# Altium integrated library main_lib.IntLib: 154 symbols (part 2 of 2)

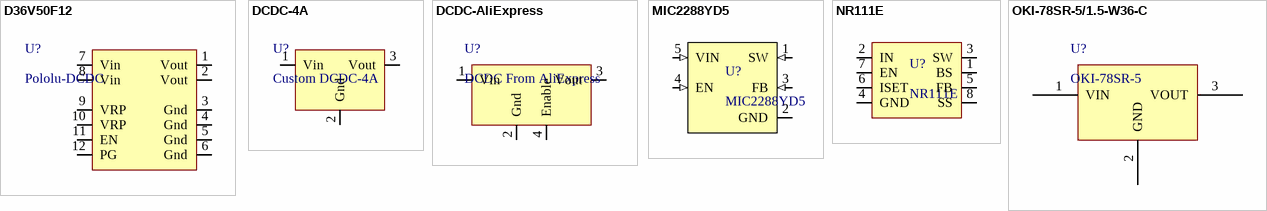
[diagram p23: symbols D36V50F12 to OKI-78SR-5/1.5-W36-C]

## D36V50F12
designator U?, comment Pololu-DCDC
Grade: None; Supplier 1: Emile; Supplier Part Number 1: N/A; HelpURL: https://github.com/mimil2014/4A-DC-DC; Package / Case: Custom; Mounted: Yes
footprint D36V50F12 (Connector; Header; 2 Position)
pins: 1 Vout, 2 Vout, 3 Gnd, 4 Gnd, 5 Gnd, 6 Gnd, 7 Vin, 8 Vin, 9 VRP, 10 VRP, 11 EN, 12 PG

## DCDC-4A
designator U?, comment Custom DCDC-4A
Custom PCB DCDC-4A; Grade: None; Supplier 1: Emile; Supplier Part Number 1: N/A; HelpURL: https://github.com/mimil2014/4A-DC-DC; Package / Case: Custom; Mounted: Yes
footprint DC-DC-4A (Connector; Header; 2 Position)
pins: 1 Vin, 2 Gnd, 3 Vout

## DCDC-AliExpress
designator U?, comment DCDC From AliExpress
DCDC Able to do 1.8v, 2.5v, 3.3v, 5v, 9v and 12v; Grade: None; Supplier 1: Aliexpress; Supplier Part Number 1: N/A; Mounted: Yes
footprint DCDC-AliExpress (Non-Isolated Switching Regulator DC-DC TO-220)
pins: 1 Vin, 2 Gnd, 3 Vout, 4 Enable

## MIC2288YD5
designator U?
Boost Switching Regulator IC Positive Adjustable 2.5V 1 Output 1.2A (Switch) SOT-23-5 Thin, TSOT-23-5; Grade: None; Supplier 1: Digi-Key; Supplier Part Number 1: 576-1729-2-ND; HelpURL: https://ww1.microchip.com/downloads/en/DeviceDoc/MIC2288-Data-Sheet-DS20006034C.pdf; Package / Case: SOT23; Mounted: Yes
footprint SOT-23-5 (SOT23-5, from TI DDC (R-PDSO-G6), modified from 6 to 5 pins)
pins: 1 SW (in), 2 GND (power), 3 FB (in), 4 EN (in), 5 VIN (in)

## NR111E
designator U?
IC REG BUCK ADJUSTABLE 4A 8SOIC; Grade: None; Supplier 1: Digi-Key; Supplier Part Number 1: NR111ECT-ND; HelpURL: https://www.digikey.ca/en/products/detail/sanken/NR111E/4289131; Package / Case: 8-SOIC-EP; Mounted: Yes
footprint SOIC-8-EXPOSED-PAD (8-Lead Plastic Small Outline, 0.15in pitch,  LTC DWG # 05-08-1610 Rev G)
pins: 1 BS, 2 IN, 3 SW, 4 GND, 5 FB, 6 ISET, 7 EN, 8 SS, 9 GND

## OKI-78SR-5/1.5-W36-C
designator U?, comment OKI-78SR-5
DC DC CONVERTER 5V 8W; Manufacturer: Murata Power Solutions Inc.; Manufacturer Part Number: OKI-78SR-5/1.5-W36-C; Voltage - Input (Min): 7V; Voltage - Input (Max): 36V; Current - Output (Max): 1.5A; Efficiency: 90.5%; Supplier 1: Digi-Key; RoHS: RoHS Compliant; Category: Power Supplies - Board Mount; Stock 1: 43226; Pricing 1: 1=6.02, 5=5.964, 10=5.922, 25=5.8376, 50=5.6556, 100=5.2916, 250=5.04568 (CAD); Packaging: Tray; Part Status: Active; Type: Linear Regulator Replacement; Voltage - Output 1: 5V; Voltage - Output 2: -; Voltage - Output 3: -; Applications: ITE (Commercial); Features: SCP; Operating Temperature: -40°C ~ 85°C; Mounting Type: Through Hole; Package / Case: 3-SIP Module; Size / Dimension: 0.41" L x 0.30" W x 0.65" H (10.4mm x 7.6mm x 16.5mm); Control Features: -; ComponentLink1URL: https://power.murata.com/data/power/oki-78sr.pdf; ComponentLink1Description: https://power.murata.com/data/power/oki-78sr.pdf; Supplier Part Number 1: 811-2196-5-ND
footprint OKI-78SR (Non-Isolated Switching Regulator DC-DC TO-220)
footprint OKI-78SR-HM (Non-Isolated Switching Regulator DC-DC TO-220 horizontal mount)
pins: 1 VIN (power), 2 GND (power), 3 VOUT (power)


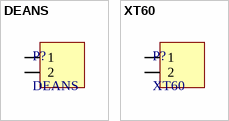
[diagram p24: symbols DEANS to XT60]

## DEANS
designator P?
Supplier 1: Digi-Key; Supplier Part Number 1: N/A277-1667-ND; Mounted: Yes; Package / Case: TH; Volt: N/A
footprint DEANS (Connector; Header; 2 Position)
pins: 1, 2

## XT60
designator P?
Supplier 1: Digi-Key; Supplier Part Number 1: N/A277-1667-ND; Mounted: Yes; Package / Case: TH; Volt: N/A
footprint XT60 (Connector; Header; 2 Position)
pins: 1, 2


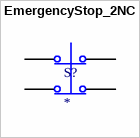
[diagram p25: symbol EmergencyStop_2NC]

## EmergencyStop_2NC
designator S?
EmergencyStop_2NC Symbol
pins: NC1-1 *, NC1-2 *, NC2-1 *, NC2-2 *


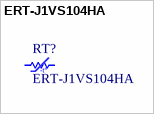
[diagram p26: symbol ERT-J1VS104HA]

## ERT-J1VS104HA
designator RT?
THERM NTC 100KOHM 4330K 0603; Value: 100K; Precision: 3%; Supplier 1: Digi-Key; Supplier Part Number 1: P12018TR-ND; Package / Case: 0603 (1608 Metric); Mounted: Yes
footprint CAPACITOR-0603 (Metric 1608, EIA 0603. Per Yageo Product Specification V2.2)
pins: 1, 2
text: -t°


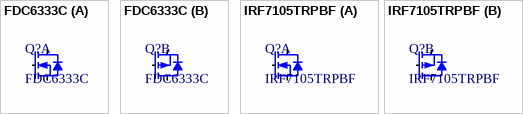
[diagram p27: symbols FDC6333C to IRF7105TRPBF]

## FDC6333C
designator Q?
Mosfet Array 30V 2.5A, 2A 700mW Surface Mount SuperSOT™-6,  A=N-CH. B=P-CH; Supplier 1: Digi-Key; Supplier Part Number 1: FDC6333CCT-ND; Volt: 30V; Package / Case: SOT-23-6 Thin; Mounted: Yes; Current: 2.5A ,2A; helpURL: https://www.onsemi.com/pdf/datasheet/fdc6333c-d.pdf
footprint SOT-23-6 (SOT23-6, from TI DDC (R-PDSO-G6))
part A pins: 1 G, 5 S, 6 D
part B pins: 2 S, 3 G, 4 D

## IRF7105TRPBF
designator Q?
Mosfet Array 25V 3.5A, 2.3A 2W Surface Mount 8-SO. A=N-CH. B=P-CH; Supplier 1: Digi-Key; Supplier Part Number 1: IRF7105PBFTR-ND; Volt: 25V; Package / Case: 8-SOIC; Mounted: Yes; Current: 3.5A ,2.3A
footprint SOIC-8-EXPOSED-PAD (8-Lead Plastic Small Outline, 0.15in pitch,  LTC DWG # 05-08-1610 Rev G)
part A pins: 1 S, 2 G, 7 D, 8 D
part B pins: 3 S, 4 G, 5 D, 6 D


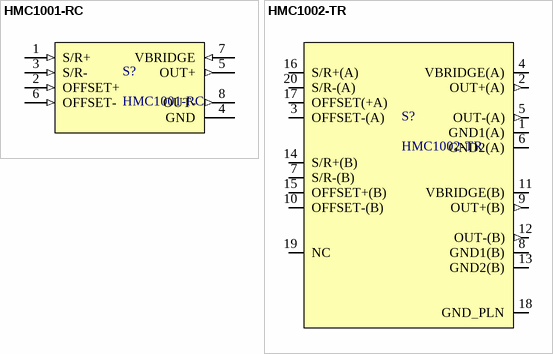
[diagram p28: symbols HMC1001-RC to HMC1002-TR]

## HMC1001-RC
designator S?
Magnetoresistive Sensor Single Axis 8- Pin SIP; Supplier 1: Digi-Key; Supplier Part Number 1: 342-1001-5-ND; Value: N/A; Precision: N/A; Package / Case: 8-SIP; Mounted: Yes
footprint SIP-8
pins: 1 S/R+ (in), 2 OFFSET+ (in), 3 S/R- (in), 4 GND (power), 5 OUT+ (out), 6 OFFSET- (in), 7 VBRIDGE (in), 8 OUT- (out)

## HMC1002-TR
designator S?
Magnetoresistive Sensor X, Y Axis 20-SOIC; Supplier 1: Digi-Key; Supplier Part Number 1: 342-1070-2-ND; Value: N/A; Precision: N/A; Package / Case: 20-SOIC; Mounted: Yes
footprint SOIC20_HNW-M
pins: 1 GND1(A) (power), 2 OUT+(A) (out), 3 OFFSET-(A) (io), 4 VBRIDGE(A), 5 OUT-(A) (out), 6 GND2(A) (power), 7 S/R-(B) (io), 8 GND1(B) (power), 9 OUT+(B) (out), 10 OFFSET-(B) (io), 11 VBRIDGE(B), 12 OUT-(B) (out), 13 GND2(B) (power), 14 S/R+(B), 15 OFFSET+(B), 16 S/R+(A), 17 OFFSET(+A), 18 GND_PLN (power), 19 NC, 20 S/R-(A) (io)


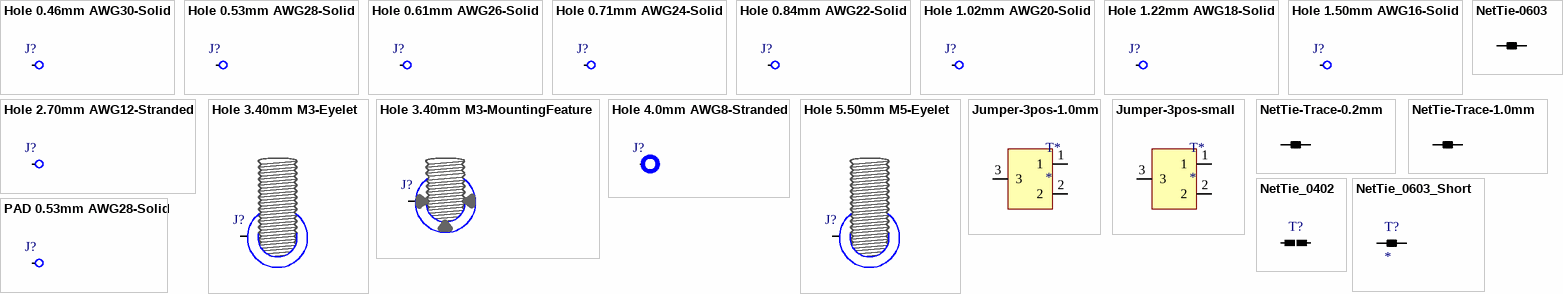
[diagram p29: symbols Hole 0.46mm AWG30-Solid to PAD 0.53mm AWG28-Solid]

## Hole 0.46mm AWG30-Solid
designator J?, comment hole  (value not drawn)  (no BOM)
Hole for 30 AWG Solid Wire; Mounted: N/A
footprint HOLE-0.46MM (Hole 0.46mm)
pins: 1

## Hole 0.53mm AWG28-Solid
designator J?, comment hole  (value not drawn)  (no BOM)
Hole for 28 AWG Solid Wire; Mounted: N/A
footprint HOLE-0.53MM (Hole 0.53mm)
pins: 1

## Hole 0.61mm AWG26-Solid
designator J?, comment hole  (value not drawn)  (no BOM)
Hole for 26 AWG Solid Wire; Mounted: N/A
footprint HOLE-0.61MM (Hole 0.61mm)
pins: 1

## Hole 0.71mm AWG24-Solid
designator J?, comment hole  (value not drawn)  (no BOM)
Hole for 24 AWG Solid Wire; Mounted: N/A
footprint HOLE-0.71MM (Hole 0.71mm)
pins: 1

## Hole 0.84mm AWG22-Solid
designator J?, comment hole  (value not drawn)  (no BOM)
Hole for 22 AWG Solid Wire; Mounted: N/A
footprint HOLE-0.84MM (Hole 0.84mm)
pins: 1

## Hole 1.02mm AWG20-Solid
designator J?, comment hole  (value not drawn)  (no BOM)
Hole for 20 AWG Solid Wire; Mounted: N/A
footprint HOLE-1.02MM (Hole 1.02mm)
pins: 1

## Hole 1.22mm AWG18-Solid
designator J?, comment hole  (value not drawn)  (no BOM)
Hole for 18 AWG Solid Wire; Mounted: N/A
footprint HOLE-1.22MM (Hole 1.22mm)
pins: 1

## Hole 1.50mm AWG16-Solid
designator J?, comment hole  (value not drawn)  (no BOM)
Hole for 16 AWG Solid Wire; Mounted: N/A
footprint HOLE-1.50MM (Hole 1.50mm)
pins: 1

## Hole 2.70mm AWG12-Stranded
designator J?, comment hole  (value not drawn)  (no BOM)
Hole for 12 AWG Stranded Wire; Mounted: N/A
footprint HOLE-2.70MM (Hole 2.70mm)
pins: 1

## Hole 3.40mm M3-Eyelet
designator J?, comment hole  (value not drawn)  (no BOM)
Hole for M3 Bolt with 8mm pad; Mounted: N/A
footprint HOLE-3.40MM-M3-8MMEYELET (Hole 3.40mm with round pad for eyelet)
pins: 1

## Hole 3.40mm M3-MountingFeature
designator J?, comment hole  (value not drawn)  (no BOM)
Hole for M3 Bolt with 7mm pad; Mounted: N/A
footprint HOLE-3.40MM-M3-7MMEYELET-MountingFeature (Hole 3.40mm with round pad for eyelet)
pins: 1

## Hole 4.0mm AWG8-Stranded
designator J?, comment hole  (value not drawn)  (no BOM)
Hole 4.0mm for 8 AWG Stranded Wire; Mounted: N/A
footprint HOLE-4.00MM (Hole 4.00mm)
pins: 1

## Hole 5.50mm M5-Eyelet
designator J?, comment hole  (value not drawn)  (no BOM)
Hole for M5 Bolt with 15mm pad; Mounted: N/A
footprint HOLE-5.50MM-M5-15MMEYELET (Hole 5.50mm with round pad for eyelet)
pins: 1

## Jumper-3pos-1.0mm
designator T*
footprint Jumper-3pos (3 pos selection)
pins: 1, 2, 3

## Jumper-3pos-small
designator T*
footprint Jumper-3pos-small (3 pos selection)
pins: 1, 2, 3

## NetTie-0603
designator T?, comment NETTIE  (value not drawn)  (net tie, no BOM)
Net Tie based on a 0603 land pattern; Mounted: N/A
footprint NetTie-0603 (NetTie based on a EIA 0603 land pattern)
pins: 1, 2

## NetTie-Trace-0.2mm
designator T?, comment NETTIE  (value not drawn)  (net tie, no BOM)
Net Tie based on a 0.2mm trace; Mounted: N/A
footprint NetTie-Trace-0.2mm (Net Tie with a 0.2mm trace)
pins: 1, 2

## NetTie-Trace-1.0mm
designator T?, comment NETTIE  (value not drawn)  (net tie, no BOM)
Net Tie based on a 1.0mm trace; Mounted: N/A
footprint NetTie-Trace-1.0mm (Net Tie with a 1.0mm trace)
pins: 1, 2

## NetTie_0402
designator T?  (value not drawn)
footprint NetTie-0402 (Metric 1005, EIA 0402 Drawn per Yageo "Chip resistors Mounting" rev 10)
pins: 1, 2

## NetTie_0603_Short
designator T?
footprint NetTie-0603-short (Net Tie with an EIA 0603 land pattern)
pins: 1, 2

## PAD 0.53mm AWG28-Solid
designator J?, comment hole  (value not drawn)  (no BOM)
PAD for 28 AWG Solid Wire; Mounted: N/A
footprint PAD-0.53MM (Hole 0.53mm)
pins: 1


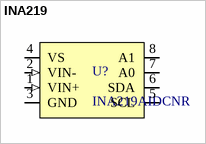
[diagram p30: symbol INA219]

## INA219
designator U?, comment INA219AIDCNR
IC CURRENT MONITOR 1% SOT23-8; Supplier 1: Digi-Key; Supplier Part Number 1: 296-23770-1-ND; Package / Case: SOT-23-8; Mounted: Yes; helpURL: https://www.ti.com/lit/ds/symlink/ina219.pdf?HQS=dis-dk-null-digikeymode-dsf-pf-null-wwe&ts=1696014906509&ref_url=https%253A%252F%252Fwww.ti.com%252Fgeneral%252Fdocs%252Fsuppproductinfo.tsp%253FdistId%253D10%2526gotoUrl%253Dhttps%253A%252F%252Fwww.ti.com%252Flit%252Fgpn%252Fina219
footprint SOT-23-8
pins: 1 VIN+ (in), 2 VIN- (in), 3 GND (power), 4 VS (power), 5 SCL, 6 SDA, 7 A0, 8 A1


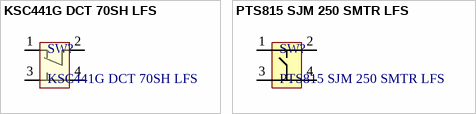
[diagram p31: symbols KSC441G DCT 70SH LFS to PTS815 SJM 250 SMTR LFS]

## KSC441G DCT 70SH LFS
designator SW?
TACT 6.2 X 6.2, 5.2 MM H, 4.75N, SPDT; Volt: 32V; Current: 0.05A; Supplier 1: Digi-Key; Supplier Part Number 1: CKN12187TR-ND; Mounted: Yes
footprint Switch_KSC441G DCT 70SH LFS
pins: 1, 2, 3, 4

## PTS815 SJM 250 SMTR LFS
designator SW?
TACT 4.2 X 3.2, 2.5 MM H, 180GF,; Volt: 12V; Current: 0.05A; Supplier 1: Digi-Key; Supplier Part Number 1: CKN12215-1-ND; Mounted: Yes
footprint SW4_PTS815 SJM 250 SMTR LFS_CNK
pins: 1, 2, 3, 4


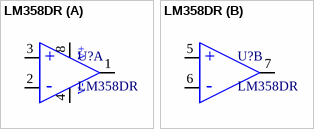
[diagram p32: symbol LM358DR]

## LM358DR
designator U?
IC OPAMP GP 2 CIRCUIT 8SOIC; Grade: None; Package / Case: SOIC-8; Mounted: Yes; helpURL: https://www.digikey.ca/en/products/detail/texas-instruments/LM358DR/276658?s=N4IgTCBcDa4JwDYC0BGADCgLEsSByAIiALoC%2BQA; Supplier 1: Digi-Key; Supplier Part Number 1: 296-1014-2-ND
footprint SOIC-8 (8-Lead Plastic Small Outline, 0.15in pitch,  LTC DWG # 05-08-1610 Rev G)
part A pins: 1 OUT1, 2 IN1-, 3 IN1+, 4 VS-, 8 VS+
part B pins: 5 IN2+, 6 IN2-, 7 OUT
part A text: V+; +; -; V-
part B text: +; -


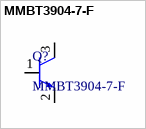
[diagram p33: symbol MMBT3904-7-F]

## MMBT3904-7-F
designator Q?
Bipolar (BJT) Transistor NPN 40 V 200 mA 300MHz 300 mW Surface Mount SOT-23-3; Volt: 40V; Supplier 1: Digi-Key; Supplier Part Number 1: MMBT3904-FDITR-ND; Package / Case: SOT-23-3; Mounted: Yes; ComponentLink1Description: DataSheet; ComponentLink1URL: https://www.diodes.com/assets/Datasheets/MMBT3904.pdf
footprint SOT-23-3 (SOT23-6, from TI DBZ (R-PDSO-G3))
pins: 1, 2, 3


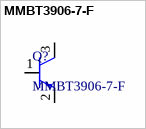
[diagram p34: symbol MMBT3906-7-F]

## MMBT3906-7-F
designator Q?
Bipolar (BJT) Transistor PNP 40 V 200 mA 250MHz 300 mW Surface Mount SOT-23-3; Volt: 20V; Supplier 1: Digi-Key; Supplier Part Number 1: MMBT3906-FDITR-ND; Package / Case: SOT-523; Mounted: Yes; ComponentLink1Description: DataSheet; ComponentLink1URL: https://www.diodes.com/assets/Datasheets/MMBT3906.pdf; HelpURL: https://www.diodes.com/assets/Datasheets/MMBT3906.pdf
footprint SOT-23-3 (SOT23-3, from TI DBZ (R-PDSO-G3))
pins: 1, 2, 3


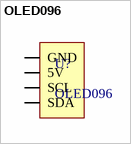
[diagram p35: symbol OLED096]

## OLED096
designator U?
OLED Display I2C 0.96in; Precision: 3%; Supplier 1: Amazon; Supplier Part Number 1: https://www.amazon.ca/-/fr/SSD1306-broches-Arduino-Raspberry-jaune-bleu-IIC/dp/B076PNP2VD/ref=sr_1_5?crid=2VV3LXPB89L69&keywords=i2c+oled&qid=1687918090&sprefix=%2Caps%2C88&sr=8-5; Value: N/A; Package / Case: 0603 (1608 Metric); Mounted: Yes
footprint OLED096
pins: 1 GND, 2 5V, 3 SCL, 4 SDA


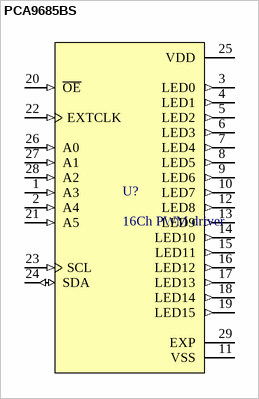
[diagram p36: symbol PCA9685BS]

## PCA9685BS
designator U?, comment 16Ch PWM driver
LED Driver IC 16 Output Linear PWM Dimming 25mA 28-HVQFN (6x6); Supplier 1: Digi-Key; Supplier Part Number 1: 568-5305-2-ND; Package / Case: 28-HVQFN (6x6); Mounted: Yes; HelpURL: https://www.nxp.com/docs/en/data-sheet/PCA9685.pdf
footprint VQFN-28 Exposed Pad
pins: 1 A3 (in), 2 A4 (in), 3 LED0 (out), 4 LED1 (out), 5 LED2 (out), 6 LED3 (out), 7 LED4 (out), 8 LED5 (out), 9 LED6 (out), 10 LED7 (out), 11 VSS (power), 12 LED8 (out), 13 LED9 (out), 14 LED10 (out), 15 LED11 (out), 16 LED12 (out), 17 LED13 (out), 18 LED14 (out), 19 LED15 (out), 20 ~{OE} (in), 21 A5 (in), 22 EXTCLK (in), 23 SCL (in), 24 SDA (io), 25 VDD (power), 26 A0 (in), 27 A1 (in), 28 A2 (in), 29 EXP (power)


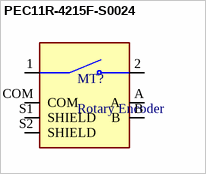
[diagram p37: symbol PEC11R-4215F-S0024]

## PEC11R-4215F-S0024
designator MT?, comment Rotary Encoder
Incremental Encoder, 12 Mm, Contact Rating 10 Ma - 5 Vdc; MP: PEC11R-4215F-S0024; Price: None; Availability: Unavailable; Value: *; Package: None
footprint XDCR_PEC11R-4215F-S0024
pins: 1, 2, A, B, COM, S1 SHIELD, S2 SHIELD


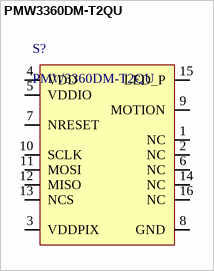
[diagram p38: symbol PMW3360DM‐T2QU]

## PMW3360DM‐T2QU
designator S?
Optical Navigation Chip; IP Protected: Yes; Supplier 1: PixArt Imaging Inc; Supplier Part Number 1: PMW3360DM‐T2QU; Value: N/A; Precision: N/A
footprint PMW3360DM-T2QU (PixArt Optical Tracking Sensor)
pins: 1 NC, 2 NC, 3 VDDPIX, 4 VDD, 5 VDDIO, 6 NC, 7 NRESET, 8 GND, 9 MOTION, 10 SCLK, 11 MOSI, 12 MISO, 13 NCS, 14 NC, 15 LED_P, 16 NC


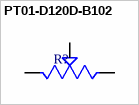
[diagram p39: symbol PT01-D120D-B102]

## PT01-D120D-B102
designator R?, comment Potentiometer  (value not drawn)
PT01-D120D-B102; Watt: 0.05W; Mounted: Yes; Package / Case: Custom; Precision: N/A; Supplier 2: Digi-Key; Supplier 1: Digi-Key; Supplier Part Number 1: PT01-D120D-B102
footprint TRIM_PT01-D120D-B102
pins: 1, 2, 3


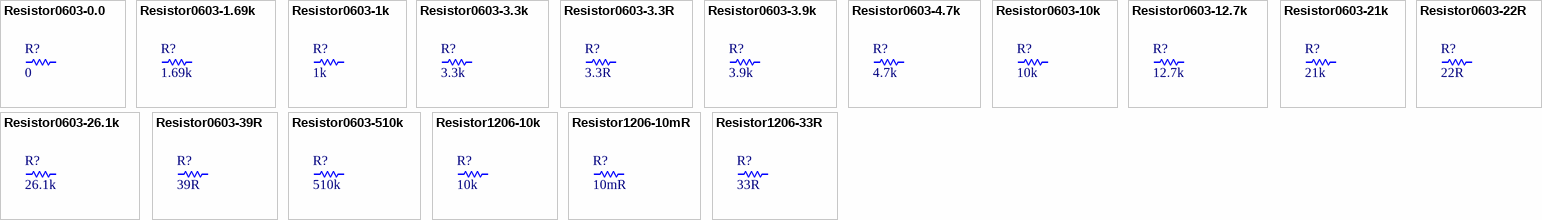
[diagram p40: symbols Resistor0603-0.0 to Resistor1206-33R]

## Resistor0603-0.0
designator R?, comment value 0  (hidden comment: SMT resistor)
Resistor0603-0.0; Precision: 1%; Watt: 0.1W; Mounted: Yes; Package / Case: Metric 1608, EIA 0603; Supplier 2: Digi-Key; Supplier 4: Digi-Key; Supplier Part Number 2: 1276-3510-2-ND; Supplier Part Number 4: 541-0.0GTR-ND; Supplier 1: Digi-Key; Supplier 3: Digi-Key; Supplier Part Number 1: RMCF0603ZT0R00TR-ND; Supplier Part Number 3: YAG1307TR-ND
footprint Resistor-0603
pins: 1, 2

## Resistor0603-1.69k
designator R?, comment value 1.69k  (hidden comment: SMT resistor)
Resistor0603-1.69k; Precision: 1%; Watt: 0.25W; Mounted: Yes; Package / Case: Metric 1608, EIA 0603; Supplier 2: Digi-Key; Supplier 4: Digi-Key; Supplier 1: Digi-Key; Supplier 3: Digi-Key; Supplier Part Number 1: RMCF0603FT1K69CT-ND
footprint Resistor-0603
pins: 1, 2

## Resistor0603-1k
designator R?, comment value 1k  (hidden comment: SMT resistor)
Resistor0603-1k; Precision: 1%; Watt: 0.1W; Mounted: Yes; Package / Case: Metric 1608, EIA 0603; Supplier 2: Digi-Key; Supplier 4: Digi-Key; Supplier Part Number 2: 311-1.00KHRTR-ND; Supplier 1: Digi-Key; Supplier 3: Digi-Key; Supplier Part Number 1: RMCF0603FT1K00TR-ND; Supplier Part Number 3: AG1307TR-ND
footprint Resistor-0603
pins: 1, 2

## Resistor0603-3.3k
designator R?, comment value 3.3k  (hidden comment: SMT resistor)
Resistor0603-3.3k; Precision: 5%; Watt: 0.25W; Mounted: Yes; Package / Case: Metric 1608, EIA 0603; Supplier 2: Digi-Key; Supplier 4: Digi-Key; Supplier 1: Digi-Key; Supplier 3: Digi-Key; Supplier Part Number 1: 311-3.30KHRCT-ND
footprint Resistor-0603
pins: 1, 2

## Resistor0603-3.3R
designator R?, comment value 3.3R  (hidden comment: SMT resistor)
Resistor0603-3.3R; Precision: 5%; Watt: 0.25W; Mounted: Yes; Package / Case: Metric 1608, EIA 0603; Supplier 2: Digi-Key; Supplier 4: Digi-Key; Supplier 1: Digi-Key; Supplier 3: Digi-Key; Supplier Part Number 1: RHM303DTR-ND
footprint Resistor-0603
pins: 1, 2

## Resistor0603-3.9k
designator R?, comment value 3.9k  (hidden comment: SMT resistor)
Resistor0603-3.9k; Precision: 1%; Watt: 0.1W; Mounted: Yes; Package / Case: Metric 1608, EIA 0603; Supplier 2: Digi-Key; Supplier 4: Digi-Key; Supplier 1: Digi-Key; Supplier 3: Digi-Key; Supplier Part Number 1: 311-3.90KHRCT-ND
footprint Resistor-0603
pins: 1, 2

## Resistor0603-4.7k
designator R?, comment value 4.7k  (hidden comment: SMT resistor)
Resistor0603-4.7k; Precision: 1%; Watt: 0.1W; Mounted: Yes; Package / Case: Metric 1608, EIA 0603; Supplier 2: Digi-Key; Supplier 4: Digi-Key; Supplier Part Number 2: RMCF0603FT4K70TR-ND; Supplier 1: Digi-Key; Supplier 3: Digi-Key; Supplier Part Number 1: 311-4.70KHRTR-ND
footprint Resistor-0603
pins: 1, 2

## Resistor0603-10k
designator R?, comment value 10k  (hidden comment: SMT resistor)
Resistor0603-10k; Precision: 1%; Watt: 0.1W; Mounted: Yes; Package / Case: Metric 1608, EIA 0603; Supplier 2: Digi-Key; Supplier 4: Digi-Key; Supplier Part Number 2: RMCF0603FT10K0TR-ND; Supplier 1: Digi-Key; Supplier 3: Digi-Key; Supplier Part Number 1: 311-10.0KHRTR-ND
footprint Resistor-0603
pins: 1, 2

## Resistor0603-12.7k
designator R?, comment value 12.7k  (hidden comment: SMT resistor)
Resistor0603-12.7k; Precision: 1%; Watt: 0.1W; Mounted: Yes; Package / Case: Metric 1608, EIA 0603; Supplier 2: Digi-Key; Supplier 4: Digi-Key; Supplier 1: Digi-Key; Supplier 3: Digi-Key; Supplier Part Number 1: RMCF0603FT12K7CT-ND
footprint Resistor-0603
pins: 1, 2

## Resistor0603-21k
designator R?, comment value 21k  (hidden comment: SMT resistor)
Resistor0603-21k; Precision: 1%; Watt: 0.1W; Mounted: Yes; Package / Case: Metric 1608, EIA 0603; Supplier 2: Digi-Key; Supplier 4: Digi-Key; Supplier 1: Digi-Key; Supplier 3: Digi-Key; Supplier Part Number 1: 311-21.0KHRCT-ND
footprint Resistor-0603
pins: 1, 2

## Resistor0603-22R
designator R?, comment value 22R  (hidden comment: SMT resistor)
Resistor0603-22R; Precision: 1%; Watt: 0.1W; Mounted: Yes; Package / Case: Metric 1608, EIA 0603; Supplier 2: Digi-Key; Supplier 4: Digi-Key; Supplier 1: Digi-Key; Supplier 3: Digi-Key; Supplier Part Number 1: RMCF0603FT22R0CT-ND
footprint Resistor-0603
pins: 1, 2

## Resistor0603-26.1k
designator R?, comment value 26.1k  (hidden comment: SMT resistor)
Resistor0603-26.1k; Precision: 1%; Watt: 0.1W; Mounted: Yes; Package / Case: Metric 1608, EIA 0603; Supplier 2: Digi-Key; Supplier 4: Digi-Key; Supplier 1: Digi-Key; Supplier 3: Digi-Key; Supplier Part Number 1: 311-26.1KHRCT-ND
footprint Resistor-0603
pins: 1, 2

## Resistor0603-39R
designator R?, comment value 39R  (hidden comment: SMT resistor)
Resistor0603-39R; Precision: 1%; Watt: 0.1W; Mounted: Yes; Package / Case: Metric 1608, EIA 0603; Supplier 2: Digi-Key; Supplier 4: Digi-Key; Supplier 1: Digi-Key; Supplier 3: Digi-Key; Supplier Part Number 1: RMCF0603FT39R0
footprint Resistor-0603
pins: 1, 2

## Resistor0603-510k
designator R?, comment value 510k  (hidden comment: SMT resistor)
Resistor0603-510k; Precision: 1%; Watt: 0.1W; Mounted: Yes; Package / Case: Metric 1608, EIA 0603; Supplier 2: Digi-Key; Supplier 4: Digi-Key; Supplier 1: Digi-Key; Supplier 3: Digi-Key; Supplier Part Number 1: P510KHCT-ND
footprint Resistor-0603
pins: 1, 2

## Resistor1206-10k
designator R?, comment value 10k  (hidden comment: SMT resistor)
Resistor1206-10k; Precision: 1%; Watt: 0.1W; Mounted: Yes; Package / Case: Metric 3216, EIA 1206; Supplier 2: Digi-Key; Supplier 4: Digi-Key; Supplier 1: Digi-Key; Supplier 3: Digi-Key; Supplier Part Number 1: RMCF1206FT10K0TR-ND
footprint RESISTOR-1206 (Metric 3216, EIA 1206. Drawn per Yageo "Chip resistors Mounting" rev 10)
pins: 1, 2

## Resistor1206-10mR
designator R?, comment value 10mR  (hidden comment: SMT resistor)
Resistor1206-10mR; Precision: 1%; Watt: 0.5W; Mounted: Yes; Package / Case: Metric 3216, EIA 1206; Supplier 2: Digi-Key; Supplier 4: Digi-Key; Supplier 1: Digi-Key; Supplier 3: Digi-Key; Supplier Part Number 1: CSR1206FT10L0CT-ND
footprint RESISTOR-1206 (Metric 3216, EIA 1206. Drawn per Yageo "Chip resistors Mounting" rev 10)
pins: 1, 2

## Resistor1206-33R
designator R?, comment value 33R  (hidden comment: SMT resistor)
Resistor1206-33R; Precision: 1%; Watt: 0.1W; Mounted: Yes; Package / Case: Metric 3216, EIA 1206; Supplier 2: Digi-Key; Supplier 4: Digi-Key; Supplier 1: Digi-Key; Supplier 3: Digi-Key; Supplier Part Number 1: 311-33.0FRTR-ND
footprint RESISTOR-1206 (Metric 3216, EIA 1206. Drawn per Yageo "Chip resistors Mounting" rev 10)
pins: 1, 2